# Altium footprint library 1.03-电容.PcbLib: 224 footprints (part 4 of 14)
Each footprint in its own frame and in the unit in brackets; x right, y up, seen from the top. Pads: shape width x height; smd on the part's side, far side on the other; paste and mask are expansions set on the pad; w line width, h text height; cw(c..) or ccw(c..) is an arc to the next point about the centre after c.
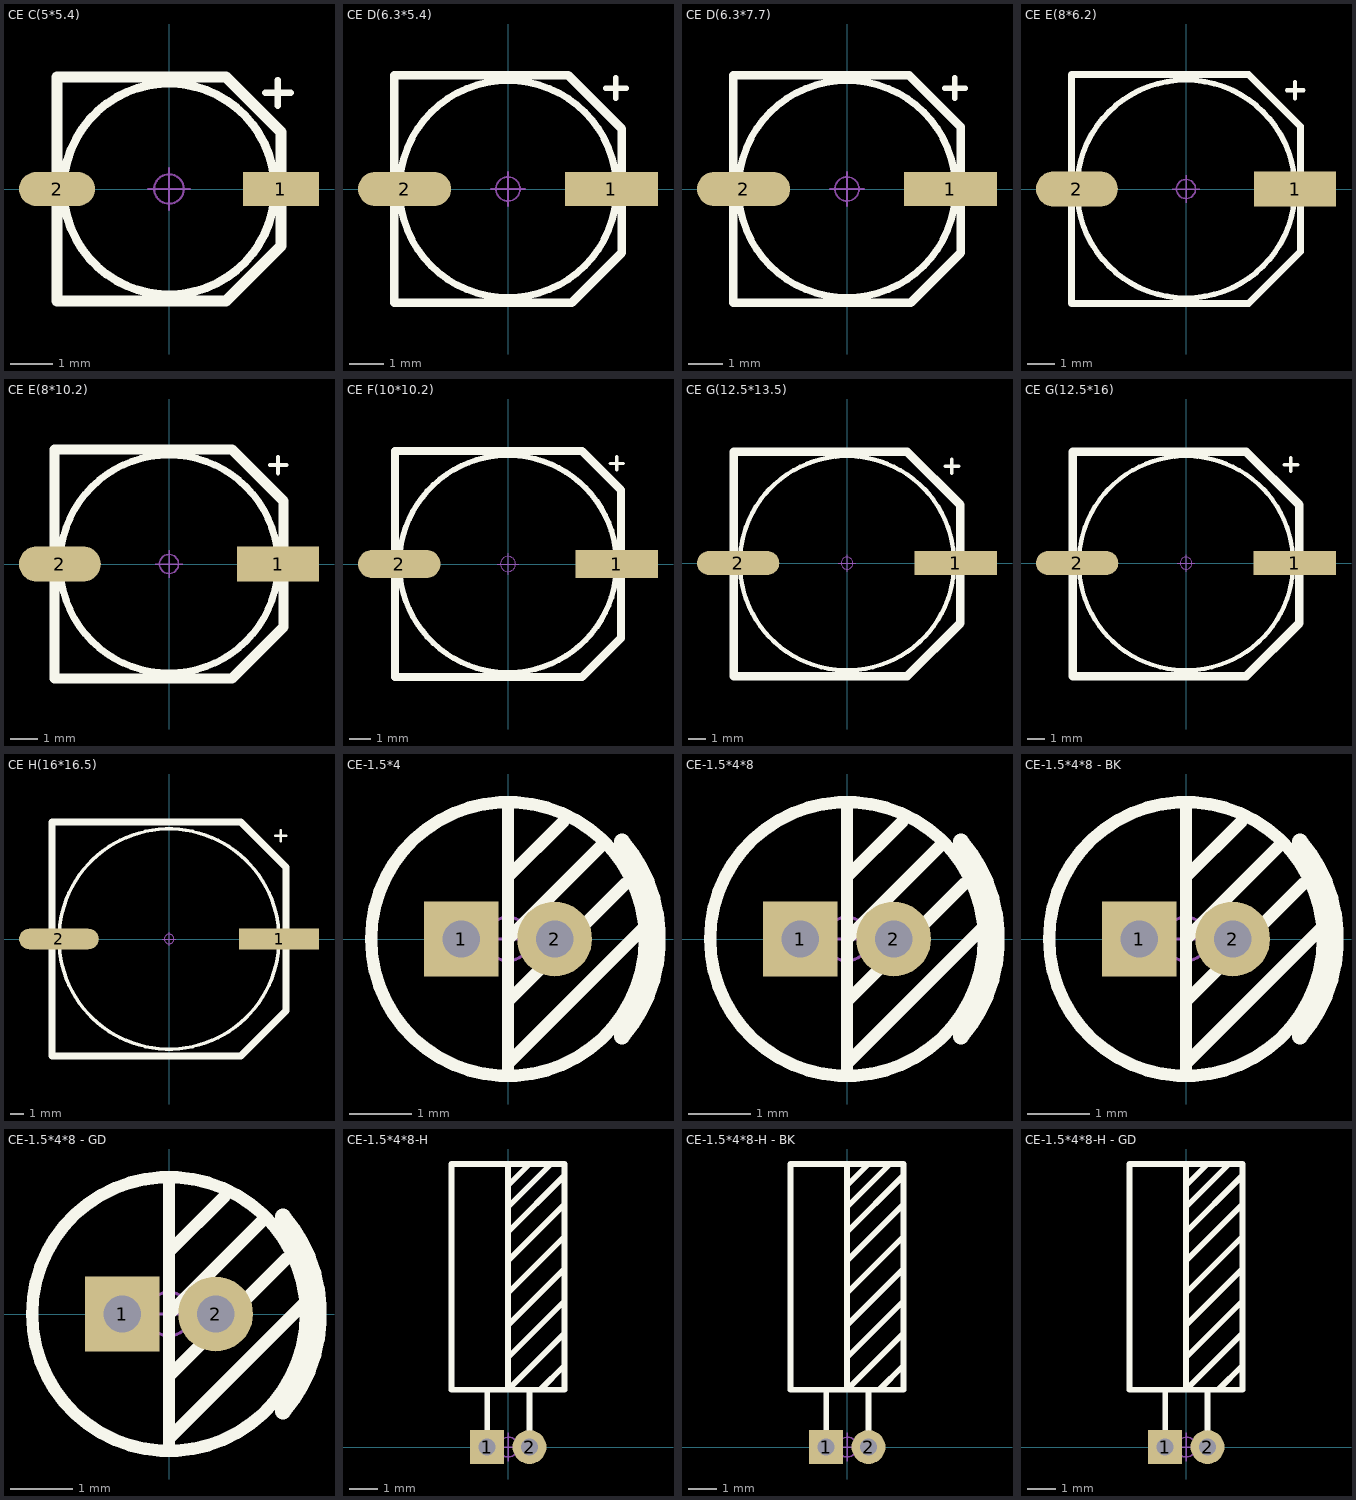
[diagram p3: the footprints below, top view; thin cyan lines are the x and y axes]

## CE C(5*5.4) [mm] "贴片电解电容，直径5mm，高5.4mm            联系卖家 免费查找封装"
pads (2):
  rect 1.8x0.8 smd: 1(2.65,0)
  oval 1.8x0.8 smd: 2(-2.65,0)
Top Overlay:
  circle w0.2: c0,0 r2.5
  lines w0.152: 2.279,2.275 2.879,2.275 ; 2.575,1.975 2.575,2.579
  lines w0.254: -2.65,-2.65 1.35,-2.65 2.65,-1.35 2.65,1.35 1.35,2.65 -2.65,2.65 -2.65,-2.65
Mechanical 15:
  circle w0.05: c0,0 r0.35
  lines w0.05: -0.5,0 0.5,0 ; 0,-0.5 0,0.5
3D body "CE_SMD_c_5x5_4.STEP": height 5.48, standoff 0.07, extent -2.95,-2.65 2.95,2.65

## CE D(6.3*5.4) [mm] "贴片电解电容，直径6.3mm，高5.4mm"
height 5.4
pads (2):
  rect 2.7x1 smd: 1(3,0)
  oval 2.7x1 smd: 2(-3,0)
Top Overlay:
  circle w0.2: c0,0 r3.15
  lines w0.152: 2.829,2.925 3.429,2.925 ; 3.125,2.625 3.125,3.229
  lines w0.254: -3.3,-3.3 1.85,-3.3 3.3,-1.85 3.3,1.75 1.75,3.3 -3.3,3.3 -3.3,-3.3
Mechanical 15:
  circle w0.05: c0,0 r0.35
  lines w0.05: -0.5,0 0.5,0 ; 0,-0.5 0,0.5
3D body "CE_SMD_63x54.STEP": height 5.45, standoff 0.04, extent -3.5,-3.3 3.5,3.3

## CE D(6.3*7.7) [mm] "贴片电解电容，直径6.3mm，高7.7mm"
pads (2):
  rect 2.7x1 smd: 1(3,0)
  oval 2.7x1 smd: 2(-3,0)
Top Overlay:
  circle w0.2: c0,0 r3.15
  lines w0.152: 2.829,2.925 3.429,2.925 ; 3.125,2.625 3.125,3.229
  lines w0.254: -3.3,-3.3 -3.3,3.3 1.8,3.3 3.3,1.8 3.3,-1.85 1.85,-3.3 -3.3,-3.3
Mechanical 15:
  circle w0.05: c0,0 r0.35
  lines w0.05: -0.5,0 0.5,0 ; 0,-0.5 0,0.5
3D body "CE_SMD_d_6_3x7_7.STEP": height 7.75, standoff 0.04, extent -3.5,-3.3 3.5,3.3

## CE E(8*6.2) [mm] "贴片电解电容，直径8mm，高6.2mm"
pads (2):
  rect 3x1.3 smd: 1(4,0)
  oval 3x1.3 smd: 2(-4,0)
Top Overlay:
  circle w0.2: c0,0 r4
  lines w0.152: 3.704,3.623 4.304,3.623 ; 4,3.323 4,3.927
  lines w0.254: -4.2,-4.2 -4.2,4.2 2.3,4.2 4.2,2.3 4.2,-2.3 2.3,-4.2 -4.2,-4.2
Mechanical 15:
  circle w0.05: c0,0 r0.35
  lines w0.05: -0.5,0 0.5,0 ; 0,-0.5 0,0.5
3D body "CE_SMD_e_8x6_2.STEP": height 6.25, standoff 0.04, extent -4.5,-4.15 4.5,4.15

## CE E(8*10.2) [mm] "贴片电解电容，直径8mm，高10.2mm"
pads (2):
  rect 3x1.3 smd: 1(4,0)
  oval 3x1.3 smd: 2(-4,0)
Top Overlay:
  circle w0.254: c0,0 r4
  lines w0.152: 3.704,3.625 4.304,3.625 ; 4,3.325 4,3.929
  lines w0.381: -4.2,-4.2 2.3,-4.2 4.2,-2.3 4.2,2.3 2.3,4.2 -4.2,4.2 -4.2,-4.2
Mechanical 15:
  circle w0.05: c0,0 r0.35
  lines w0.05: -0.5,0 0.5,0 ; 0,-0.5 0,0.5
3D body "CE_SMD_e_8x10_2.STEP": height 10.25, standoff 0.04, extent -4.5,-4.15 4.5,4.15

## CE F(10*10.2) [mm] "贴片电解电容，直径10mm，高10.2mm"
pads (2):
  rect 3.8x1.3 smd: 1(5,0)
  oval 3.8x1.3 smd: 2(-5,0)
Top Overlay:
  circle w0.254: c0,0 r5
  lines w0.152: 4.704,4.625 5.304,4.625 ; 5,4.325 5,4.929
  lines w0.381: 5.191,-3.413 3.404,-5.2 -5.2,-5.2 -5.2,5.2 3.404,5.2 5.2,3.404 5.2,-3.404
Mechanical 15:
  circle w0.05: c0,0 r0.35
  lines w0.05: -0.5,0 0.5,0 ; 0,-0.5 0,0.5
3D body "CE_SMD_f_10x10_2.STEP": height 10.28, standoff 0.07, extent -5.8,-5.15 5.8,5.15

## CE G(12.5*13.5) [mm] "贴片电解电容，直径12.5mm，高13.5mm"
pads (2):
  rect 4.8x1.4 smd: 1(6.35,0)
  oval 4.8x1.4 smd: 2(-6.35,0)
Top Overlay:
  circle w0.254: c0,0 r6.25
  lines w0.2: 5.725,5.65 6.525,5.65 ; 6.121,5.25 6.121,6.05
  lines w0.508: -6.6,-6.6 -6.6,6.5 3.5,6.5 6.6,3.4 6.6,-3.5 3.5,-6.6 -6.6,-6.6
Mechanical 15:
  circle w0.05: c0,0 r0.35
  lines w0.05: -0.5,0 0.5,0 ; 0,-0.5 0,0.5
3D body "CE_SMD_g_12_5x13_5.STEP": height 13.58, standoff 0.07, extent -7.15,-6.5 7.15,6.5

## CE G(12.5*16) [mm] "贴片电解电容，直径12.5mm，高16mm"
pads (2):
  rect 4.8x1.4 smd: 1(6.35,0)
  oval 4.8x1.4 smd: 2(-6.35,0)
Top Overlay:
  circle w0.254: c0,0 r6.25
  lines w0.2: 5.725,5.75 6.525,5.75 ; 6.121,5.35 6.121,6.15
  lines w0.508: -6.6,-6.6 -6.6,6.5 3.5,6.5 6.6,3.4 6.6,-3.5 3.5,-6.6 -6.6,-6.6
Mechanical 15:
  circle w0.05: c0,0 r0.35
  lines w0.05: -0.5,0 0.5,0 ; 0,-0.5 0,0.5
3D body "CE_SMD_g_12_5x16.STEP": height 16.08, standoff 0.07, extent -7.15,-6.5 7.15,6.5

## CE H(16*16.5) [mm] "贴片电解电容，直径16mm，高16.5mm            联系卖家 免费查找封装"
pads (2):
  rect 5.8x1.5 smd: 1(8.001,0)
  oval 5.8x1.5 smd: 2(-8.001,0)
Top Overlay:
  circle w0.254: c0,0 r8
  lines w0.2: 7.725,7.5 8.525,7.5 ; 8.121,7.1 8.121,7.9
  lines w0.508: -8.5,-8.5 -8.5,8.5 5.216,8.5 8.5,5.216 8.5,-5.216 5.216,-8.5 -8.5,-8.5
Mechanical 15:
  circle w0.05: c0,0 r0.35
  lines w0.05: -0.5,0 0.5,0 ; 0,-0.5 0,0.5
3D body "CE_SMD_h_16x16_5.STEP": height 16.58, standoff 0.07, extent -9.4,-8.5 9.4,8.5

## CE-1.5*4 [mm] "直插电解电容-脚距1.5mm直径4mm高度8mm"
pads (2):
  rect 1.2x1.2 hole 0.6: 1(-0.75,0)
  round 1.2 hole 0.6: 2(0.75,0)
Top Overlay:
  circle w0.2: c0,0 r2.2
  lines w0.2: 0,-2.159 0,-2 ; 0,-1 1.897,0.897 ; 0,0 1.524,1.524 ; 0,1 0.897,1.897 ; 0,2.159 0,-2 ; 2.207,0.206 0,-2
  lines w0.254: 1.83,-1.568 ccw(c0,0) 1.83,1.568
Mechanical 15:
  circle w0.05: c0,0 r0.35
  lines w0.05: -0.5,0 0.5,0 ; 0,-0.5 0,0.5
3D body "CE_TH_1_5x4x8-4347.STEP": height 8.15, standoff -3.35, extent -2,-1.999 2.02,2

## CE-1.5*4*8 [mm] "直插电解电容-脚距1.5mm直径4mm高度8mm"
pads (2):
  rect 1.2x1.2 hole 0.6: 1(-0.75,0)
  round 1.2 hole 0.6: 2(0.75,0)
Top Overlay:
  circle w0.2: c0,0 r2.2
  lines w0.2: 0,-2.159 0,-2 ; 0,-1 1.897,0.897 ; 0,0 1.524,1.524 ; 0,1 0.897,1.897 ; 0,2.159 0,-2 ; 2.207,0.206 0,-2
  lines w0.254: 1.83,-1.568 ccw(c0,0) 1.83,1.568
Mechanical 15:
  circle w0.05: c0,0 r0.35
  lines w0.05: -0.5,0 0.5,0 ; 0,-0.5 0,0.5
3D body "CE_TH_1_5x4x8_.STEP": height 8.15, standoff -3.35, extent -2,-1.999 2.02,2

## CE-1.5*4*8 - BK [mm] "直插电解电容-脚距1.5mm直径4mm高度8mm      联系卖家 免费查找封装"
pads (2):
  rect 1.2x1.2 hole 0.6: 1(-0.75,0)
  round 1.2 hole 0.6: 2(0.75,0)
Top Overlay:
  circle w0.2: c0,0 r2.2
  lines w0.2: 0,-2.159 0,-2 ; 0,-1 1.897,0.897 ; 0,0 1.524,1.524 ; 0,1 0.897,1.897 ; 0,2.159 0,-2 ; 2.207,0.206 0,-2
  lines w0.254: 1.83,-1.568 ccw(c0,0) 1.83,1.568
Mechanical 15:
  circle w0.05: c0,0 r0.35
  lines w0.05: -0.5,0 0.5,0 ; 0,-0.5 0,0.5
3D body "CE_TH_1_5x4x8-6020-2.STEP": height 8.15, standoff -3.35, extent -2,-1.999 2.02,1.999

## CE-1.5*4*8 - GD [mm] "直插电解电容-脚距1.5mm直径4mm高度8mm"
pads (2):
  rect 1.2x1.2 hole 0.6: 1(-0.75,0)
  round 1.2 hole 0.6: 2(0.75,0)
Top Overlay:
  circle w0.2: c0,0 r2.2
  lines w0.2: 0,-2.159 0,-2 ; 0,-1 1.897,0.897 ; 0,0 1.524,1.524 ; 0,1 0.897,1.897 ; 0,2.159 0,-2 ; 2.207,0.206 0,-2
  lines w0.254: 1.83,-1.568 ccw(c0,0) 1.83,1.568
Mechanical 15:
  circle w0.05: c0,0 r0.35
  lines w0.05: -0.5,0 0.5,0 ; 0,-0.5 0,0.5
3D body "CE_TH_1_5x4x8-4347.STEP": height 8.15, standoff -3.35, extent -2,-1.999 2.02,2

## CE-1.5*4*8-H [mm] "直插电解电容-脚距1.5mm直径4mm高度8mm"
pads (2):
  rect 1.2x1.2 hole 0.6: 1(-0.75,0)
  round 1.2 hole 0.6: 2(0.75,0)
Top Overlay:
  lines w0.2: -0.75,0 -0.75,2 ; -0.012,3.175 1.988,5.175 1.988,5.207 ; -0.012,4.318 1.988,6.318 1.988,6.35 ; -0.012,5.461 1.988,7.461 1.988,7.493 ; -0.012,6.604 1.988,8.604 1.988,8.636 ; -0.012,7.62 1.965,9.597 ccw(c1.911,9.652) 1.988,9.652 ; -0.012,8.509 1.51,10.031 cw(c1.512,10.03) 1.512,10.032 ; -0.012,9.271 0.748,10.031 cw(c0.75,10.03) 0.75,10.032 ; -0.012,10.032 -0.012,2.032 ; 0.75,0 0.75,2 ; 0.877,2.921 -0.012,2.032 ; 1.131,2.032 1.988,2.889 1.988,2.921 ; 1.988,4.064 1.988,4.032 -0.012,2.032 ; -2.012,2.032 -2.012,10.032 1.988,10.032 1.988,2.032 -2.012,2.032
Mechanical 15:
  circle w0.05: c0,0 r0.35
  lines w0.05: -0.5,0 0.5,0 ; 0,-0.5 0,0.5
3D body "CE_TH_1_5x4x8-h_.STEP": height 4.13, standoff -3.37, extent -2,-0.25 2.02,10

## CE-1.5*4*8-H - BK [mm] "直插电解电容-脚距1.5mm直径4mm高度8mm"
pads (2):
  rect 1.2x1.2 hole 0.6: 1(-0.75,0)
  round 1.2 hole 0.6: 2(0.75,0)
Top Overlay:
  lines w0.2: -0.75,0 -0.75,2 ; -0.012,3.175 1.988,5.175 1.988,5.207 ; -0.012,4.318 1.988,6.318 1.988,6.35 ; -0.012,5.461 1.988,7.461 1.988,7.493 ; -0.012,6.604 1.988,8.604 1.988,8.636 ; -0.012,7.62 1.965,9.597 ccw(c1.911,9.652) 1.988,9.652 ; -0.012,8.509 1.51,10.031 cw(c1.512,10.03) 1.512,10.032 ; -0.012,9.271 0.748,10.031 cw(c0.75,10.03) 0.75,10.032 ; -0.012,10.032 -0.012,2.032 ; 0.75,0 0.75,2 ; 0.877,2.921 -0.012,2.032 ; 1.131,2.032 1.988,2.889 1.988,2.921 ; 1.988,4.064 1.988,4.032 -0.012,2.032 ; -2.012,2.032 1.988,2.032 1.988,10.032 -2.012,10.032 -2.012,2.032
Mechanical 15:
  circle w0.05: c0,0 r0.35
  lines w0.05: -0.5,0 0.5,0 ; 0,-0.5 0,0.5
3D body "CE_TH_1_5x4x8-h.STEP": height 4.03, standoff -3.47, extent -2.012,-0.198 2.008,10.052

## CE-1.5*4*8-H - GD [mm] "直插电解电容-脚距1.5mm直径4mm高度8mm         淘宝卖家ID:黄晶宝石"
pads (2):
  rect 1.2x1.2 hole 0.6: 1(-0.75,0)
  round 1.2 hole 0.6: 2(0.75,0)
Top Overlay:
  lines w0.2: -0.75,0 -0.75,2 ; -0.012,3.175 1.988,5.175 1.988,5.207 ; -0.012,4.318 1.988,6.318 1.988,6.35 ; -0.012,5.461 1.988,7.461 1.988,7.493 ; -0.012,6.604 1.988,8.604 1.988,8.636 ; -0.012,7.62 1.965,9.597 ccw(c1.911,9.652) 1.988,9.652 ; -0.012,8.509 1.51,10.031 cw(c1.512,10.03) 1.512,10.032 ; -0.012,9.271 0.748,10.031 cw(c0.75,10.03) 0.75,10.032 ; -0.012,10.032 -0.012,2.032 ; 0.75,0 0.75,2 ; 0.877,2.921 -0.012,2.032 ; 1.131,2.032 1.988,2.889 1.988,2.921 ; 1.988,4.064 1.988,4.032 -0.012,2.032 ; -2.012,2.032 1.988,2.032 1.988,10.032 -2.012,10.032 -2.012,2.032
Mechanical 15:
  circle w0.05: c0,0 r0.35
  lines w0.05: -0.5,0 0.5,0 ; 0,-0.5 0,0.5
3D body "CE_TH_1_5x4x8-h.STEP": height 4.25, standoff -3.25, extent -2.01,-0.275 2.01,9.975